# Altium footprint library micromouse pcb library.PcbLib: 68 footprints (part 3 of 5)
Each footprint in its own frame and in the unit in brackets; x right, y up, seen from the top. Pads: shape width x height; smd on the part's side, far side on the other; paste and mask are expansions set on the pad; w line width, h text height; cw(c..) or ccw(c..) is an arc to the next point about the centre after c.
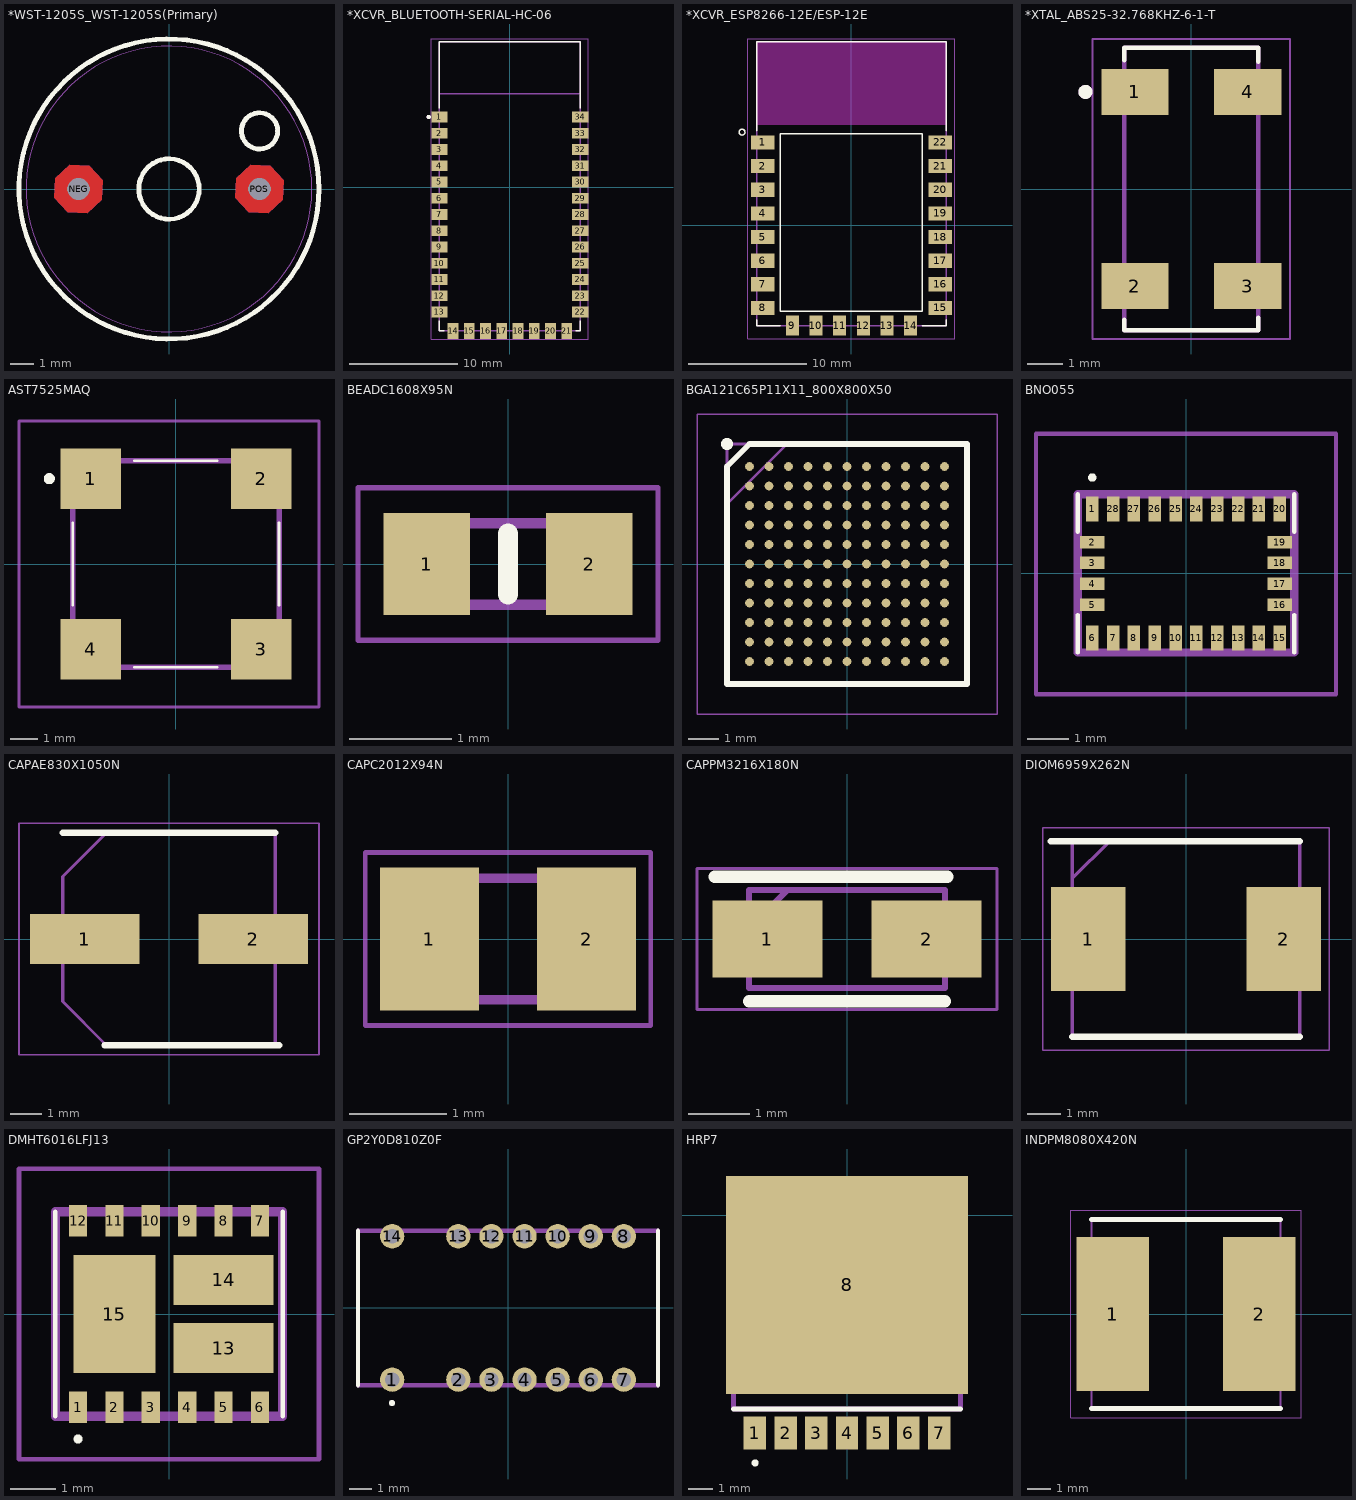
[diagram p2: the footprints below, top view; thin cyan lines are the x and y axes]

## *WST-1205S_WST-1205S(Primary) [mil]
pads (2):
  round 36 hole 36: NEG(-149.61,0) POS(149.61,0)
Top Layer:
  region: -109.67,14.54 -131.65,38.52 -164.14,39.94 -188.12,17.96 -189.54,-14.54 -167.57,-38.52 -135.07,-39.94 -111.09,-17.96
  region: 189.54,14.54 167.57,38.52 135.07,39.94 111.09,17.96 109.67,-14.54 131.65,-38.52 164.14,-39.94 188.12,-17.96
Bottom Layer:
  region: -109.67,14.54 -131.65,38.52 -164.14,39.94 -188.12,17.96 -189.54,-14.54 -167.57,-38.52 -135.07,-39.94 -111.09,-17.96
  region: 189.54,14.54 167.57,38.52 135.07,39.94 111.09,17.96 109.67,-14.54 131.65,-38.52 164.14,-39.94 188.12,-17.96
Top Overlay:
  circle w8: c149.69,96.06 r30
  circle w8: c0,0 r248.03
  circle w8: c0,0 r50
Mechanical 4:
  circle w2: c0,0 r236.22
  circle w2: c0,0 r236.22
Multi-Layer:
  region: -109.67,14.54 -131.65,38.52 -164.14,39.94 -188.12,17.96 -189.54,-14.54 -167.57,-38.52 -135.07,-39.94 -111.09,-17.96
  region: 189.54,14.54 167.57,38.52 135.07,39.94 111.09,17.96 109.67,-14.54 131.65,-38.52 164.14,-39.94 188.12,-17.96
3D body "WST-1205S--3DModel-STEP-56544.STEP": height 393.7, standoff -157.48, extent -236.22,-236.21 236.22,236.23

## *XCVR_BLUETOOTH-SERIAL-HC-06 [mm]
pads (34):
  rect 1.5x1 smd: 1(-6.5,6.5) 2(-6.5,5) 3(-6.5,3.5) 4(-6.5,2) 5(-6.5,0.5) 6(-6.5,-1) 7(-6.5,-2.5) 8(-6.5,-4) 9(-6.5,-5.5) 10(-6.5,-7) 11(-6.5,-8.5) 12(-6.5,-10) 13(-6.5,-11.5) 22(6.5,-11.5) 23(6.5,-10) 24(6.5,-8.5) 25(6.5,-7) 26(6.5,-5.5) 27(6.5,-4) 28(6.5,-2.5) 29(6.5,-1) 30(6.5,0.5) 31(6.5,2) 32(6.5,3.5) 33(6.5,5) 34(6.5,6.5)
  rect 1x1.5 smd: 14(-5.25,-13.25) 15(-3.75,-13.25) 16(-2.25,-13.25) 17(-0.75,-13.25) 18(0.75,-13.25) 19(2.25,-13.25) 20(3.75,-13.25) 21(5.25,-13.25)
Top Overlay:
  circle w0.2: c-7.5,6.5 r0.1
  lines w0.127: -6.5,-12.314 -6.5,-13.25 -6.064,-13.25 ; -6.5,7.314 -6.5,13.45 6.5,13.45 6.5,7.314 ; 6.064,-13.25 6.5,-13.25 6.5,-12.314
Mechanical 4:
  circle w0.2: c-7.5,6.5 r0.1
  circle w0.2: c-7.5,6.5 r0.1
  lines w0.127: -6.5,-13.25 -6.5,8.65 ; -6.5,-13.25 6.5,-13.25 ; -6.5,-13.25 -6.5,8.65 ; -6.5,-13.25 6.5,-13.25 ; -6.5,8.65 6.5,8.65 ; -6.5,8.65 -6.5,13.45 ; -6.5,8.65 6.5,8.65 ; -6.5,8.65 -6.5,13.45 ; -6.5,13.45 6.5,13.45 ; -6.5,13.45 6.5,13.45 ; 6.5,-13.25 6.5,8.65 ; 6.5,-13.25 6.5,8.65 ; 6.5,8.65 6.5,13.45 ; 6.5,8.65 6.5,13.45
  text "ANTENNA" at -3.81,9.91 h1.88
  text "ANTENNA" at -3.81,9.91 h1.88
Mechanical 16:
  lines w0.05: -7.25,-14 -7.25,13.7 7.25,13.7 7.25,-14 -7.25,-14
3D body "bluetooth2.STEP": height 4.3, standoff 0, extent -6.5,-12.751 6.5,14.249

## *XCVR_ESP8266-12E/ESP-12E [mm]
pads (22):
  rect 2x1.2 smd: 1(-7.5,7) 2(-7.5,5) 3(-7.5,3) 4(-7.5,1) 5(-7.5,-1) 6(-7.5,-3) 7(-7.5,-5) 8(-7.5,-7) 15(7.5,-7) 16(7.5,-5) 17(7.5,-3) 18(7.5,-1) 19(7.5,1) 20(7.5,3) 21(7.5,5) 22(7.5,7)
  rect 1.1x1.7 smd: 9(-5,-8.5) 10(-3,-8.5) 11(-1,-8.5) 12(1,-8.5) 13(3,-8.5) 14(5,-8.5)
Top Overlay:
  circle w0.127: c-9.25,7.875 r0.25
  lines w0.127: -8,-8 -8,-8.5 -6,-8.5 ; -8,8 -8,15.5 8,15.5 8,8 ; 6,-8.5 8,-8.5 8,-8 ; -6,-7.26 -6,7.74 6,7.74 6,-7.26 -6,-7.26
Keep-Out Layer:
  region: -8.009,15.5 8,15.5 8,8.51 -8.009,8.51
  region: -8.009,15.5 8,15.5 8,8.51 -8.009,8.51
  region: -8.009,15.5 8,15.5 8,8.51 -8.009,8.51
  region: -8.009,15.5 8,15.5 8,8.51 -8.009,8.51
  region: -8.009,15.5 8,15.5 8,8.51 -8.009,8.51
  region: -8.009,15.5 8,15.5 8,8.51 -8.009,8.51
Mechanical 4:
  lines w0.127: -8,-8.5 -8,15.5 ; -8,-8.5 8,-8.5 ; -8,-8.5 -8,15.5 ; -8,-8.5 8,-8.5 ; -8,15.5 8,15.5 ; -8,15.5 8,15.5 ; 8,-8.5 8,15.5 ; 8,-8.5 8,15.5
Mechanical 16:
  lines w0.05: -8.75,-9.625 -8.75,15.75 8.75,15.75 8.75,-9.625 -8.75,-9.625
3D body "ESP-12F.step": height 2.9, standoff -0.05, extent -8,-8.484 8,15.516

## *XTAL_ABS25-32.768KHZ-6-1-T [mm]
pads (4):
  rect 1.9x1.3 smd: 1(-1.6,2.75) 2(-1.6,-2.75) 3(1.6,-2.75) 4(1.6,2.75)
Top Overlay:
  circle w0.2: c-3,2.75 r0.1
  lines w0.127: -1.9,-3.7 -1.9,-4 1.9,-4 1.9,-3.65 ; -1.9,3.65 -1.9,4 1.9,4 1.9,3.6
Mechanical 4:
  circle w0.2: c-3,2.75 r0.1
  circle w0.2: c-3,2.75 r0.1
  lines w0.127: -1.9,-4 1.9,-4 ; -1.9,-4 -1.9,4 ; -1.9,-4 1.9,-4 ; -1.9,-4 -1.9,4 ; -1.9,4 1.9,4 ; -1.9,4 1.9,4 ; 1.9,-4 1.9,4 ; 1.9,-4 1.9,4
Mechanical 16:
  lines w0.05: -2.8,-4.25 2.8,-4.25 2.8,4.25 -2.8,4.25 -2.8,-4.25
3D body "ABRACON_ABS25-32.768KHZ-6-T.STEP": height 2.66, standoff 0, extent -2,-4 2,4

## AST7525MAQ [mm]
pads (4):
  rect 2.2x2.2 smd: 1(-3.1,3.1) 2(3.1,3.1) 3(3.1,-3.1) 4(-3.1,-3.1)
Top Overlay:
  lines w0.1: -3.75,-1.5 -3.75,1.5 ; -1.5,-3.75 1.5,-3.75 ; -1.5,3.75 1.5,3.75 ; 3.75,-1.5 3.75,1.5
  lines w0.2: -4.6,3 cw(c-4.6,3.1) -4.6,3.2 cw(c-4.6,3.1) -4.6,3
Mechanical 13:
  lines w0.2: -3.75,-3.75 -3.75,3.75 3.75,3.75 3.75,-3.75 -3.75,-3.75
Mechanical 15:
  lines w0.1: -5.7,-5.2 -5.7,5.2 5.2,5.2 5.2,-5.2 -5.7,-5.2
3D body "AST7525MAQ.stp": height 2.6, standoff 0, extent -3.98,-3.98 3.98,3.98

## BEADC1608X95N [mm]
pads (2):
  rect 0.85x1 smd: 1(-0.8,0) 2(0.8,0)
Top Overlay:
  lines w0.2: 0,-0.3 0,0.3
Mechanical 13:
  lines w0.1: -0.8,-0.4 -0.8,0.4 0.8,0.4 0.8,-0.4 -0.8,-0.4
Mechanical 15:
  lines w0.05: -1.475,-0.75 -1.475,0.75 1.475,0.75 1.475,-0.75 -1.475,-0.75
3D body "BLM18AG102SH1D.stp": height 0.95, standoff 0, extent -0.8,-0.4 0.8,0.4

## BGA121C65P11X11_800X800X50 [mm]
pads (121):
  round 0.29 smd: A1(-3.25,3.25) A2(-2.6,3.25) A3(-1.95,3.25) A4(-1.3,3.25) A5(-0.65,3.25) A6(0,3.25) A7(0.65,3.25) A8(1.3,3.25) A9(1.95,3.25) A10(2.6,3.25) A11(3.25,3.25) B1(-3.25,2.6) B2(-2.6,2.6) B3(-1.95,2.6) B4(-1.3,2.6) B5(-0.65,2.6) B6(0,2.6) B7(0.65,2.6) B8(1.3,2.6) B9(1.95,2.6) B10(2.6,2.6) B11(3.25,2.6) C1(-3.25,1.95) C2(-2.6,1.95) C3(-1.95,1.95) C4(-1.3,1.95) C5(-0.65,1.95) C6(0,1.95) C7(0.65,1.95) C8(1.3,1.95) C9(1.95,1.95) C10(2.6,1.95) C11(3.25,1.95) D1(-3.25,1.3) D2(-2.6,1.3) D3(-1.95,1.3) D4(-1.3,1.3) D5(-0.65,1.3) D6(0,1.3) D7(0.65,1.3) D8(1.3,1.3) D9(1.95,1.3) D10(2.6,1.3) D11(3.25,1.3) E1(-3.25,0.65) E2(-2.6,0.65) E3(-1.95,0.65) E4(-1.3,0.65) E5(-0.65,0.65) E6(0,0.65) E7(0.65,0.65) E8(1.3,0.65) E9(1.95,0.65) E10(2.6,0.65) E11(3.25,0.65) F1(-3.25,0) F2(-2.6,0) F3(-1.95,0) F4(-1.3,0) F5(-0.65,0) F6(0,0) F7(0.65,0) F8(1.3,0) F9(1.95,0) F10(2.6,0) F11(3.25,0) G1(-3.25,-0.65) G2(-2.6,-0.65) G3(-1.95,-0.65) G4(-1.3,-0.65) G5(-0.65,-0.65) G6(0,-0.65) G7(0.65,-0.65) G8(1.3,-0.65) G9(1.95,-0.65) G10(2.6,-0.65) G11(3.25,-0.65) H1(-3.25,-1.3) H2(-2.6,-1.3) H3(-1.95,-1.3) H4(-1.3,-1.3) H5(-0.65,-1.3) H6(0,-1.3) H7(0.65,-1.3) H8(1.3,-1.3) H9(1.95,-1.3) H10(2.6,-1.3) H11(3.25,-1.3) J1(-3.25,-1.95) J2(-2.6,-1.95) J3(-1.95,-1.95) J4(-1.3,-1.95) J5(-0.65,-1.95) J6(0,-1.95) J7(0.65,-1.95) J8(1.3,-1.95) J9(1.95,-1.95) J10(2.6,-1.95) J11(3.25,-1.95) K1(-3.25,-2.6) K2(-2.6,-2.6) K3(-1.95,-2.6) K4(-1.3,-2.6) K5(-0.65,-2.6) K6(0,-2.6) K7(0.65,-2.6) K8(1.3,-2.6) K9(1.95,-2.6) K10(2.6,-2.6) K11(3.25,-2.6) L1(-3.25,-3.25) L2(-2.6,-3.25) L3(-1.95,-3.25) L4(-1.3,-3.25) L5(-0.65,-3.25) L6(0,-3.25) L7(0.65,-3.25) L8(1.3,-3.25) L9(1.95,-3.25) L10(2.6,-3.25) L11(3.25,-3.25)
Top Overlay:
  circle w0.2: c-4,4 r0.1
  lines w0.2: -4,-4 4,-4 4,4 -3.25,4 -4,3.25 -4,-4
Mechanical 13:
  lines w0.1: -4,2 -2,4 ; -4,-4 4,-4 4,4 -4,4 -4,-4
Mechanical 15:
  lines w0.05: -5,-5 5,-5 5,5 -5,5 -5,-5
3D body "MK64FX512VDC12.stp": height 0.5, standoff 0, extent -4,-4 4,4

## BNO055 [mm]
pads (28):
  rect 0.3x0.6 smd: 1(-2.25,1.55) 6(-2.25,-1.55) 7(-1.75,-1.55) 8(-1.25,-1.55) 9(-0.75,-1.55) 10(-0.25,-1.55) 11(0.25,-1.55) 12(0.75,-1.55) 13(1.25,-1.55) 14(1.75,-1.55) 15(2.25,-1.55) 20(2.25,1.55) 21(1.75,1.55) 22(1.25,1.55) 23(0.75,1.55) 24(0.25,1.55) 25(-0.25,1.55) 26(-0.75,1.55) 27(-1.25,1.55) 28(-1.75,1.55)
  rect 0.6x0.3 smd: 2(-2.25,0.75) 3(-2.25,0.25) 4(-2.25,-0.25) 5(-2.25,-0.75) 16(2.25,-0.75) 17(2.25,-0.25) 18(2.25,0.25) 19(2.25,0.75)
Top Overlay:
  lines w0.1: -2.6,-1.9 -2.6,-1 ; -2.6,1 -2.6,1.9 ; 2.6,-1.9 2.6,-1 ; 2.6,1 2.6,1.9 ; -2.3,2.3 ccw(c-2.25,2.3) -2.2,2.3 ccw(c-2.25,2.3) -2.3,2.3
Mechanical 13:
  lines w0.2: -2.6,-1.9 -2.6,1.9 2.6,1.9 2.6,-1.9 -2.6,-1.9
Mechanical 15:
  lines w0.1: -3.6,-2.9 -3.6,3.35 3.6,3.35 3.6,-2.9 -3.6,-2.9
3D body "BNO055.stp": height 1.1, standoff 0, extent -2.6,-1.9 2.6,1.9

## CAPAE830X1050N [mm]
pads (2):
  rect 3.5x1.6 smd: 1(-2.7,0) 2(2.7,0)
Top Overlay:
  lines w0.2: -3.4,3.4 3.4,3.4 ; -2.066,-3.404 3.525,-3.404
Mechanical 13:
  lines w0.1: -3.4,-2 -2,-3.406 3.4,-3.406 3.4,3.4 -2,3.4 -3.4,2 -3.4,-2
Mechanical 15:
  lines w0.05: -4.8,-3.7 -4.8,3.7 4.8,3.7 4.8,-3.7 -4.8,-3.7
3D body "CAPAE-D6.3x5.4.stp": height 5.5, standoff 0, extent -3.9,-3.4 3.9,3.4

## CAPC2012X94N [mm]
pads (2):
  rect 1.02x1.47 smd: 1(-0.81,0) 2(0.81,0)
Mechanical 13:
  lines w0.1: -1.005,-0.625 -1.005,0.625 1.005,0.625 1.005,-0.625 -1.005,-0.625
Mechanical 15:
  lines w0.05: -1.47,-0.89 -1.47,0.89 1.47,0.89 1.47,-0.89 -1.47,-0.89
3D body "08055A101JAT2A.stp": height 0.94, standoff 0, extent -1.005,-0.625 1.005,0.625

## CAPPM3216X180N [mm]
pads (2):
  rect 1.8x1.25 smd: 1(-1.3,0) 2(1.3,0)
Top Overlay:
  lines w0.2: -2.159,1.016 1.641,1.016 ; -1.6,-1.016 1.6,-1.016
Mechanical 13:
  lines w0.1: -1.6,0.175 -0.975,0.8 ; -1.6,-0.8 1.6,-0.8 1.6,0.8 -1.6,0.8 -1.6,-0.8
Mechanical 15:
  lines w0.05: -2.45,-1.15 2.45,-1.15 2.45,1.15 -2.45,1.15 -2.45,-1.15
3D body "293D104X9035A2TE3.stp": height 1.8, standoff 0, extent -1.6,-0.8 1.6,0.8

## DIOM6959X262N [mm]
pads (2):
  rect 2.25x3.15 smd: 1(-2.95,0) 2(2.95,0)
Top Overlay:
  lines w0.2: -4.075,2.952 3.428,2.952 ; -3.428,-2.952 3.428,-2.952
Mechanical 13:
  lines w0.1: -3.428,1.828 -2.302,2.952 ; -3.428,-2.952 -3.428,2.952 3.428,2.952 3.428,-2.952 -3.428,-2.952
Mechanical 15:
  lines w0.05: -4.325,-3.36 -4.325,3.36 4.325,3.36 4.325,-3.36 -4.325,-3.36
3D body "SS34.stp": height 2.62, standoff 0, extent -3.427,-2.953 3.427,2.953

## DMHT6016LFJ13 [mm]
pads (15):
  rect 0.4x0.7 smd: 1(-2,-2.05) 2(-1.2,-2.05) 3(-0.4,-2.05) 4(0.4,-2.05) 5(1.2,-2.05) 6(2,-2.05) 7(2,2.05) 8(1.2,2.05) 9(0.4,2.05) 10(-0.4,2.05) 11(-1.2,2.05) 12(-2,2.05)
  rect 2.2x1.1 smd: 13(1.2,-0.75) 14(1.2,0.75)
  rect 1.8x2.6 smd: 15(-1.2,0)
Top Overlay:
  lines w0.1: -2.5,-2.25 -2.5,2.25 ; 2.5,-2.25 2.5,2.25 ; -2,-2.8 ccw(c-2,-2.75) -2,-2.7 ccw(c-2,-2.75) -2,-2.8
Mechanical 13:
  lines w0.2: -2.5,-2.25 -2.5,2.25 2.5,2.25 2.5,-2.25 -2.5,-2.25
Mechanical 15:
  lines w0.1: -3.3,-3.2 -3.3,3.2 3.3,3.2 3.3,-3.2 -3.3,-3.2
3D body "DMHT6016LFJ-13.stp": height 0.9, standoff 0, extent -2.5,-2.36 2.5,2.36

## GP2Y0D810Z0F [mm]
pads (14):
  round 1.1 hole 0.65: 1(-5.25,-3.25) 2(-2.25,-3.25) 3(-0.75,-3.25) 4(0.75,-3.25) 5(2.25,-3.25) 6(3.75,-3.25) 7(5.25,-3.25) 8(5.25,3.25) 9(3.75,3.25) 10(2.25,3.25) 11(0.75,3.25) 12(-0.75,3.25) 13(-2.25,3.25) 14(-5.25,3.25)
Top Overlay:
  circle w0.2: c-5.264,-4.311 r0.039
  lines w0.2: -6.8,-3.5 -6.8,3.5 ; 6.8,-3.5 6.8,3.5
Mechanical 13:
  lines w0.2: -6.8,-3.5 -6.8,3.5 6.8,3.5 6.8,-3.5 -6.8,-3.5
3D body "GP2Y0D810Z0F sharp.STEP": height 8.03, standoff -2.75, extent -6.769,-3.531 6.831,3.469

## HRP7 [mm]
pads (8):
  rect 0.93x1.37 smd: 1(-3.81,-9) 2(-2.54,-9) 3(-1.27,-9) 4(0,-9) 5(1.27,-9) 6(2.54,-9) 7(3.81,-9)
  rect 10x9 smd: 8(0,-2.875)
Top Overlay:
  circle w0.2: c-3.797,-10.233 r0.046
  lines w0.2: -4.695,-8 4.695,-8
Mechanical 13:
  lines w0.2: -4.695,-8 -4.695,0 4.695,0 4.695,-8 -4.695,-8

## INDPM8080X420N [mm]
pads (2):
  rect 3.05x6.5 smd: 1(-3.1,0) 2(3.1,0)
Top Overlay:
  lines w0.2: -4,-4 4,-4 ; -4,4 4,4
Mechanical 13:
  lines w0.1: -4,-4 -4,4 4,4 4,-4 -4,-4
Mechanical 15:
  lines w0.05: -4.875,-4.4 -4.875,4.4 4.875,4.4 4.875,-4.4 -4.875,-4.4
3D body "CDRH104R.STEP": height 3.8, standoff 0, extent -5.05,-4.95 5.05,4.95